# Altium footprint library self_pcblib v1.8.6.PcbLib: 164 footprints (part 5 of 11)
Each footprint in its own frame and in the unit in brackets; x right, y up, seen from the top. Pads: shape width x height; smd on the part's side, far side on the other; paste and mask are expansions set on the pad; w line width, h text height; cw(c..) or ccw(c..) is an arc to the next point about the centre after c.
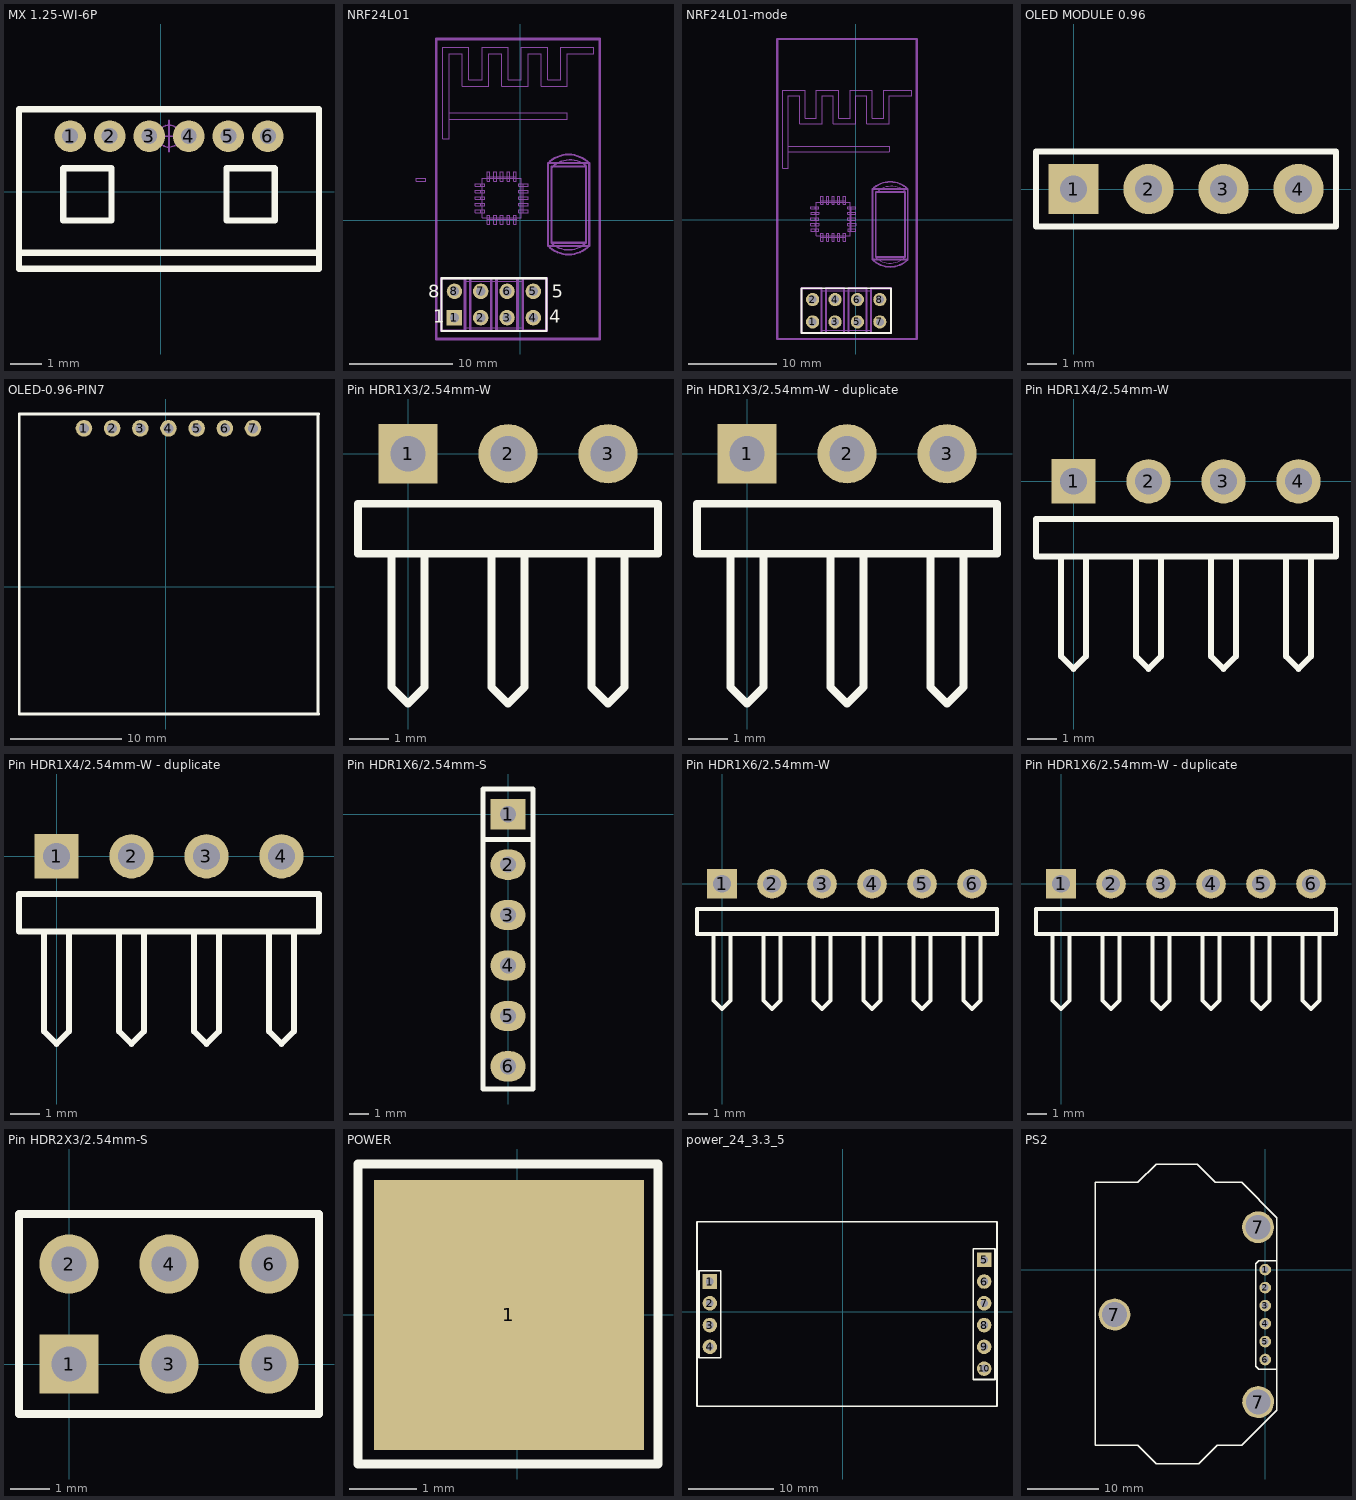
[diagram p4: the footprints below, top view; thin cyan lines are the x and y axes]

## MX 1.25-WI-6P [mm]
pads (6):
  round 1 hole 0.5: 1(-2.859,1.755) 2(-1.609,1.755) 3(-0.359,1.755) 4(0.891,1.755) 5(2.141,1.755) 6(3.391,1.755)
Top Overlay:
  lines w0.2: -4.473,-1.928 5.005,-1.928 ; -4.473,-2.436 -4.473,2.605 5.005,2.605 5.005,-2.436 -4.473,-2.436 ; -3.076,-0.912 -3.076,0.739 -1.552,0.739 -1.552,-0.912 -3.076,-0.912 ; 2.084,-0.912 2.084,0.739 3.608,0.739 3.608,-0.912 2.084,-0.912
Mechanical 15:
  circle w0.05: c0.266,1.755 r0.35
  lines w0.05: -0.234,1.755 0.766,1.755 ; 0.266,1.255 0.266,2.255
3D body "MOLEX1.25-WI-6P.STEP": height 3.35, standoff -2.1, extent -4.359,-2.295 4.891,2.605

## NRF24L01 [mm]
pads (8):
  rect 1.5x1.5 hole 0.9: 1(-6.35,-9.398)
  round 1.5 hole 0.9: 2(-3.81,-9.398) 3(-1.27,-9.398) 4(1.27,-9.398) 5(1.27,-6.858) 6(-1.27,-6.858) 7(-3.81,-6.858) 8(-6.35,-6.858)
Top Overlay:
  lines w0.2: -7.62,-10.668 2.54,-10.668 2.54,-5.588 -7.62,-5.588 -7.62,-10.668
  text "5" at 3.048,-7.493 h1.27
  text "1" at -8.382,-9.906 h1.27
  text "4" at 2.794,-9.906 h1.27
  text "8" at -8.89,-7.493 h1.27
Mechanical 1:
  drawing of 171 lines, arcs and shapes, not listed
3D body: height 2, standoff 0, extent 0.254,-10.668 2.54,-5.588
3D body: height 2, standoff 0, extent -0.254,-10.361 0.254,-5.861
3D body: height 2, standoff 0, extent -2.286,-10.668 -0.254,-5.588
3D body: height 2, standoff 0, extent -2.818,-10.361 -2.286,-5.861
3D body: height 2, standoff 0, extent -4.826,-10.668 -2.794,-5.588
3D body: height 2, standoff 0, extent -5.334,-10.361 -4.826,-5.861
3D body: height 2, standoff 0, extent -7.62,-10.668 -5.334,-5.588
3D body: height 3, standoff 2, extent -8.118,-11.461 7.682,17.539
3D body: height 4, standoff 0, extent 0.921,-7.208 1.619,-6.511
3D body: height 4, standoff 0, extent 0.921,-9.748 1.62,-9.051
3D body: height 4, standoff 0, extent -1.619,-7.208 -0.92,-6.511
3D body: height 4, standoff 0, extent -1.619,-9.748 -0.92,-9.051
3D body: height 4, standoff 0, extent -4.159,-7.208 -3.46,-6.511
3D body: height 4, standoff 0, extent -4.159,-9.748 -3.46,-9.051
3D body: height 4, standoff 0, extent -6.699,-7.208 -6,-6.511
3D body: height 4, standoff 0, extent -6.699,-9.748 -6,-9.051
3D body: height 4, standoff 0, extent -6.699,-9.748 -6.001,-9.051
3D body: height 4, standoff 0, extent -6.699,-7.208 -6.001,-6.511
3D body: height 4, standoff 0, extent -4.159,-7.208 -3.461,-6.511
3D body: height 4, standoff 0, extent -4.159,-9.748 -3.46,-9.051
3D body: height 4, standoff 0, extent -1.619,-9.748 -0.92,-9.051
3D body: height 4, standoff 0, extent -1.619,-7.208 -0.92,-6.511
3D body: height 4, standoff 0, extent 0.921,-7.208 1.62,-6.511
3D body: height 4, standoff 0, extent 0.921,-9.748 1.62,-9.051
3D body: height 3.5, standoff 3, extent 2.682,-2.461 6.682,5.539
3D body: height 3.5, standoff 3, extent 2.586,2.439 6.778,6.622
3D body: height 3.5, standoff 3, extent 2.586,-3.561 6.778,0.622
3D body: height 5, standoff 3, extent 2.983,2.598 6.416,6.024
3D body: height 5, standoff 3, extent 3.11,-2.736 6.543,0.69
3D body: height 5, standoff 3.5, extent 3.048,-2.159 6.35,5.207
3D body: height 3.5, standoff 3, extent -3.683,0.254 0.127,4.064
3D body: height 3.1, standoff 3, extent -4.318,3.302 -3.81,3.556
3D body: height 3.1, standoff 3, extent -4.318,2.667 -3.828,2.921
3D body: height 3.1, standoff 3, extent -4.313,2.032 -3.823,2.286
3D body: height 3.1, standoff 3, extent -4.318,1.397 -3.828,1.651
3D body: height 3.1, standoff 3, extent -4.318,0.762 -3.828,1.016
3D body: height 3.1, standoff 3, extent -3.175,-0.381 -2.908,0.099
3D body: height 3.1, standoff 3, extent -2.54,-0.381 -2.286,0.099
3D body: height 3.1, standoff 3, extent -1.905,-0.381 -1.651,0.099
3D body: height 3.1, standoff 3, extent -1.27,-0.381 -1.016,0.099
3D body: height 3.1, standoff 3, extent -0.635,-0.381 -0.381,0.099
3D body: height 3.1, standoff 3, extent 0.282,0.762 0.762,1.016
3D body: height 3.1, standoff 3, extent 0.282,1.397 0.762,1.651
3D body: height 3.1, standoff 3, extent 0.282,2.032 0.762,2.286
3D body: height 3.1, standoff 3, extent 0.282,2.667 0.762,2.921
3D body: height 3.1, standoff 3, extent 0.282,3.302 0.762,3.556
3D body: height 3.1, standoff 3, extent -0.648,4.219 -0.381,4.699
3D body: height 3.1, standoff 3, extent -1.27,4.229 -1.016,4.699
3D body: height 3.1, standoff 3, extent -1.905,4.219 -1.651,4.699
3D body: height 3.1, standoff 3, extent -2.54,4.229 -2.286,4.699
3D body: height 3.1, standoff 3, extent -3.175,4.229 -2.921,4.699
3D body: height 3.25, standoff 3, extent -0.127,3.302 0.282,3.556
3D body: height 3.25, standoff 3, extent -0.127,2.667 0.282,2.921
3D body: height 3.25, standoff 3, extent -0.127,2.032 0.282,2.286
3D body: height 3.25, standoff 3, extent -0.127,1.397 0.282,1.651
3D body: height 3.25, standoff 3, extent -0.127,0.762 0.282,1.016
3D body: height 3.25, standoff 3, extent -0.635,0.089 -0.381,0.508
3D body: height 3.25, standoff 3, extent -1.27,0.099 -1.016,0.508
3D body: height 3.25, standoff 3, extent -1.918,0.099 -1.651,0.508
3D body: height 3.25, standoff 3, extent -2.54,0.099 -2.286,0.508
3D body: height 3.25, standoff 3, extent -3.175,0.099 -2.921,0.508
3D body: height 3.25, standoff 3, extent -3.828,0.762 -3.429,1.016
3D body: height 3.25, standoff 3, extent -3.828,1.397 -3.429,1.651
3D body: height 3.25, standoff 3, extent -3.828,2.032 -3.429,2.286
3D body: height 3.25, standoff 3, extent -3.828,2.667 -3.429,2.921
3D body: height 3.25, standoff 3, extent -3.81,3.302 -3.429,3.556
3D body: height 3.25, standoff 3, extent -3.175,3.81 -2.921,4.229
3D body: height 3.25, standoff 3, extent -2.54,3.81 -2.286,4.219
3D body: height 3.25, standoff 3, extent -1.905,3.81 -1.651,4.219
3D body: height 3.25, standoff 3, extent -1.27,3.81 -1.016,4.219
3D body: height 3.25, standoff 3, extent -0.635,3.81 -0.381,4.219
3D body: height 3.01, standoff 3, extent -7.493,7.874 7.112,16.764
3D body: height 3.01, standoff 3, extent -6.858,9.779 4.572,10.414

## NRF24L01-mode [mm]
pads (8):
  round 1.5 hole 0.9: 1(-4.902,-11.582) 2(-4.902,-9.042) 3(-2.362,-11.582) 4(-2.362,-9.042) 5(0.178,-11.582) 6(0.178,-9.042) 7(2.718,-11.582) 8(2.718,-9.042)
Top Overlay:
  lines w0.2: -6.172,-12.852 3.988,-12.852 3.988,-7.772 -6.172,-7.772 -6.172,-12.852
Mechanical 1:
  drawing of 167 lines, arcs and shapes, not listed
3D body: height 2, standoff 0, extent 1.702,-12.852 3.988,-7.772
3D body: height 2, standoff 0, extent 1.194,-12.545 1.702,-8.045
3D body: height 2, standoff 0, extent -0.838,-12.852 1.194,-7.772
3D body: height 2, standoff 0, extent -1.37,-12.545 -0.838,-8.045
3D body: height 2, standoff 0, extent -3.378,-12.852 -1.346,-7.772
3D body: height 2, standoff 0, extent -3.886,-12.545 -3.378,-8.045
3D body: height 2, standoff 0, extent -6.172,-12.852 -3.886,-7.772
3D body: height 3, standoff 2, extent -8.905,-13.518 6.895,15.482
3D body: height 4, standoff 0, extent 2.369,-9.392 3.067,-8.695
3D body: height 4, standoff 0, extent 2.369,-11.933 3.067,-11.235
3D body: height 4, standoff 0, extent -0.171,-9.393 0.527,-8.695
3D body: height 4, standoff 0, extent -0.171,-11.933 0.527,-11.235
3D body: height 4, standoff 0, extent -2.711,-9.393 -2.013,-8.695
3D body: height 4, standoff 0, extent -2.711,-11.933 -2.013,-11.235
3D body: height 4, standoff 0, extent -5.251,-9.392 -4.553,-8.695
3D body: height 4, standoff 0, extent -5.251,-11.933 -4.553,-11.235
3D body: height 4, standoff 0, extent -5.251,-11.933 -4.553,-11.235
3D body: height 4, standoff 0, extent -5.251,-9.393 -4.553,-8.695
3D body: height 4, standoff 0, extent -2.711,-9.392 -2.013,-8.695
3D body: height 4, standoff 0, extent -2.711,-11.933 -2.013,-11.235
3D body: height 4, standoff 0, extent -0.171,-11.932 0.527,-11.235
3D body: height 4, standoff 0, extent -0.171,-9.392 0.527,-8.695
3D body: height 4, standoff 0, extent 2.369,-9.393 3.067,-8.695
3D body: height 4, standoff 0, extent 2.369,-11.933 3.067,-11.235
3D body: height 3.5, standoff 3, extent 1.895,-4.518 5.895,3.482
3D body: height 3.5, standoff 3, extent 1.799,0.381 5.991,4.565
3D body: height 3.5, standoff 3, extent 1.799,-5.619 5.991,-1.435
3D body: height 5, standoff 3, extent 2.195,0.54 5.628,3.967
3D body: height 5, standoff 3, extent 2.322,-4.793 5.755,-1.367
3D body: height 5, standoff 3.5, extent 2.261,-4.216 5.563,3.15
3D body: height 3.5, standoff 3, extent -4.47,-1.803 -0.66,2.007
3D body: height 3.1, standoff 3, extent -5.105,1.245 -4.597,1.499
3D body: height 3.1, standoff 3, extent -5.105,0.61 -4.615,0.864
3D body: height 3.1, standoff 3, extent -5.1,-0.025 -4.61,0.229
3D body: height 3.1, standoff 3, extent -5.105,-0.66 -4.615,-0.406
3D body: height 3.1, standoff 3, extent -5.105,-1.295 -4.615,-1.041
3D body: height 3.1, standoff 3, extent -3.962,-2.438 -3.695,-1.958
3D body: height 3.1, standoff 3, extent -3.327,-2.438 -3.073,-1.958
3D body: height 3.1, standoff 3, extent -2.692,-2.438 -2.438,-1.958
3D body: height 3.1, standoff 3, extent -2.057,-2.438 -1.803,-1.958
3D body: height 3.1, standoff 3, extent -1.422,-2.438 -1.168,-1.958
3D body: height 3.1, standoff 3, extent -0.505,-1.295 -0.025,-1.041
3D body: height 3.1, standoff 3, extent -0.505,-0.66 -0.025,-0.406
3D body: height 3.1, standoff 3, extent -0.505,-0.025 -0.025,0.229
3D body: height 3.1, standoff 3, extent -0.505,0.61 -0.025,0.864
3D body: height 3.1, standoff 3, extent -0.505,1.245 -0.025,1.499
3D body: height 3.1, standoff 3, extent -1.435,2.162 -1.168,2.642
3D body: height 3.1, standoff 3, extent -2.057,2.172 -1.803,2.642
3D body: height 3.1, standoff 3, extent -2.692,2.162 -2.438,2.642
3D body: height 3.1, standoff 3, extent -3.327,2.172 -3.073,2.642
3D body: height 3.1, standoff 3, extent -3.962,2.172 -3.708,2.642
3D body: height 3.25, standoff 3, extent -0.914,1.245 -0.505,1.499
3D body: height 3.25, standoff 3, extent -0.914,0.61 -0.505,0.864
3D body: height 3.25, standoff 3, extent -0.914,-0.025 -0.505,0.229
3D body: height 3.25, standoff 3, extent -0.914,-0.66 -0.505,-0.406
3D body: height 3.25, standoff 3, extent -0.914,-1.295 -0.505,-1.041
3D body: height 3.25, standoff 3, extent -1.422,-1.968 -1.168,-1.549
3D body: height 3.25, standoff 3, extent -2.057,-1.958 -1.803,-1.549
3D body: height 3.25, standoff 3, extent -2.705,-1.958 -2.438,-1.549
3D body: height 3.25, standoff 3, extent -3.327,-1.958 -3.073,-1.549
3D body: height 3.25, standoff 3, extent -3.962,-1.958 -3.708,-1.549
3D body: height 3.25, standoff 3, extent -4.615,-1.295 -4.216,-1.041
3D body: height 3.25, standoff 3, extent -4.615,-0.66 -4.216,-0.406
3D body: height 3.25, standoff 3, extent -4.615,-0.025 -4.216,0.229
3D body: height 3.25, standoff 3, extent -4.615,0.61 -4.216,0.864
3D body: height 3.25, standoff 3, extent -4.597,1.245 -4.216,1.499
3D body: height 3.25, standoff 3, extent -3.962,1.753 -3.708,2.172
3D body: height 3.25, standoff 3, extent -3.327,1.753 -3.073,2.162
3D body: height 3.25, standoff 3, extent -2.692,1.753 -2.438,2.162
3D body: height 3.25, standoff 3, extent -2.057,1.753 -1.803,2.162
3D body: height 3.25, standoff 3, extent -1.422,1.753 -1.168,2.162
3D body: height 3.01, standoff 3, extent -8.28,5.817 6.325,14.707
3D body: height 3.01, standoff 3, extent -7.645,7.722 3.785,8.357

## OLED MODULE 0.96 [mm] "0.96寸OLED显示屏"
pads (4):
  rect 1.7x1.7 hole 0.9: 1(0,0)
  round 1.7 hole 0.9: 2(2.54,0) 3(5.08,0) 4(7.62,0)
Top Overlay:
  lines w0.2: -1.27,-1.27 -1.27,1.27 8.89,1.27 8.89,-1.27 -1.27,-1.27
3D body "User Library-128x64I2COLEDDisplayAdafruit.STEP": height 13.47, standoff 2.63, extent -9.65,-25.46 17.05,2.4
3D body "HDR2.54-1P_M.STEP": height 8.5, standoff -3, extent 1.27,-1.27 3.81,1.27
3D body "HDR2.54-1P_M.STEP": height 8.5, standoff -3, extent -1.27,-1.27 1.27,1.27
3D body "HDR2.54-1P_M.STEP": height 8.5, standoff -3, extent 6.35,-1.27 8.89,1.27
3D body "HDR2.54-1P_M.STEP": height 8.5, standoff -3, extent 3.81,-1.27 6.35,1.27

## OLED-0.96-PIN7 [mm]
pads (7):
  round 1.5 hole 0.9: 1(-7.366,14.301) 2(-4.826,14.301) 3(-2.286,14.301) 4(0.254,14.301) 5(2.794,14.301) 6(5.334,14.301) 7(7.874,14.301)
Top Overlay:
  lines w0.254: -13.2,-11.456 13.8,-11.456 ; -13.2,-11.405 -13.2,15.595 13.8,15.595 ; 13.724,-11.456 13.724,15.595
3D body "OLED-0.96.step": height 3.22, standoff -0.62, extent -12.946,-9.932 13.754,12.272

## Pin HDR1X3/2.54mm-W [mm] "Connector; Header; 3 Position; Right Angle"
pads (3):
  rect 1.5x1.5 hole 0.9: 1(0,0)
  round 1.5 hole 0.9: 2(2.54,0) 3(5.08,0)
Top Overlay:
  lines w0.2: -0.423,-2.54 -0.423,-5.927 0,-6.35 0.423,-5.927 0.423,-2.54 ; 2.117,-2.54 2.117,-5.927 2.54,-6.35 2.963,-5.927 2.963,-2.54 ; 4.657,-2.54 4.657,-5.927 5.08,-6.35 5.503,-5.927 5.503,-2.54 ; -1.27,-2.54 -1.27,-1.27 6.35,-1.27 6.35,-2.54 -1.27,-2.54
3D body "hdr3.stp": height 2.54, standoff -1, extent -1.27,-9.969 6.35,0.381

## Pin HDR1X3/2.54mm-W - duplicate [mm] "Connector; Header; 3 Position; Right Angle"
pads (3):
  rect 1.5x1.5 hole 0.9: 1(0,0)
  round 1.5 hole 0.9: 2(2.54,0) 3(5.08,0)
Top Overlay:
  lines w0.2: -0.423,-2.54 -0.423,-5.927 0,-6.35 0.423,-5.927 0.423,-2.54 ; 2.117,-2.54 2.117,-5.927 2.54,-6.35 2.963,-5.927 2.963,-2.54 ; 4.657,-2.54 4.657,-5.927 5.08,-6.35 5.503,-5.927 5.503,-2.54 ; -1.27,-2.54 6.35,-2.54 6.35,-1.27 -1.27,-1.27 -1.27,-2.54
3D body "hdr3.stp": height 2.54, standoff -1, extent -1.27,-9.969 6.35,0.381

## Pin HDR1X4/2.54mm-W [mm] "Connector; Header; 4 Position; Right Angle"
pads (4):
  rect 1.5x1.5 hole 0.9: 1(0,0)
  round 1.5 hole 0.9: 2(2.54,0) 3(5.08,0) 4(7.62,0)
Top Overlay:
  lines w0.2: -0.423,-2.54 -0.423,-5.927 0,-6.35 0.423,-5.927 0.423,-2.54 ; 2.117,-2.54 2.117,-5.927 2.54,-6.35 2.963,-5.927 2.963,-2.54 ; 4.657,-2.54 4.657,-5.927 5.08,-6.35 5.503,-5.927 5.503,-2.54 ; 7.197,-2.54 7.197,-5.927 7.62,-6.35 8.043,-5.927 8.043,-2.54 ; -1.27,-2.54 -1.27,-1.27 8.89,-1.27 8.89,-2.54 -1.27,-2.54
3D body "hdr4.stp": height 2.54, standoff -1, extent -1.27,-10.001 8.89,0.349

## Pin HDR1X4/2.54mm-W - duplicate [mm] "Connector; Header; 4 Position; Right Angle"
pads (4):
  rect 1.5x1.5 hole 0.9: 1(0,0)
  round 1.5 hole 0.9: 2(2.54,0) 3(5.08,0) 4(7.62,0)
Top Overlay:
  lines w0.2: -0.423,-2.54 -0.423,-5.927 0,-6.35 0.423,-5.927 0.423,-2.54 ; 2.117,-2.54 2.117,-5.927 2.54,-6.35 2.963,-5.927 2.963,-2.54 ; 4.657,-2.54 4.657,-5.927 5.08,-6.35 5.503,-5.927 5.503,-2.54 ; 7.197,-2.54 7.197,-5.927 7.62,-6.35 8.043,-5.927 8.043,-2.54 ; -1.27,-2.54 -1.27,-1.27 8.89,-1.27 8.89,-2.54 -1.27,-2.54
3D body "hdr4.stp": height 2.54, standoff -1, extent -1.27,-10.001 8.89,0.349

## Pin HDR1X6/2.54mm-S [mil]
pads (6):
  rect 70x60 hole 32: 1(0,0)
  oval 70x60 hole 32: 2(0,-100) 3(0,-200) 4(0,-300) 5(0,-400) 6(0,-500)
Top Overlay:
  lines w10: -50,-50 50,-50 ; -50,-545 -50,50 50,50 50,-545 -50,-545
3D body "1001-6.STEP": height 336.22, standoff -118.11, extent -50,-545 50,55

## Pin HDR1X6/2.54mm-W [mm] "Connector; Header; 6 Position; Right Angle"
pads (6):
  rect 1.5x1.5 hole 0.9: 1(0,0)
  round 1.5 hole 0.9: 2(2.54,0) 3(5.08,0) 4(7.62,0) 5(10.16,0) 6(12.7,0)
Top Overlay:
  lines w0.2: -0.423,-2.54 -0.423,-5.927 0,-6.35 0.423,-5.927 0.423,-2.54 ; 2.117,-2.54 2.117,-5.927 2.54,-6.35 2.963,-5.927 2.963,-2.54 ; 4.657,-2.54 4.657,-5.927 5.08,-6.35 5.503,-5.927 5.503,-2.54 ; 7.197,-2.54 7.197,-5.927 7.62,-6.35 8.043,-5.927 8.043,-2.54 ; 9.737,-2.54 9.737,-5.927 10.16,-6.35 10.583,-5.927 10.583,-2.54 ; 12.277,-2.54 12.277,-5.927 12.7,-6.35 13.123,-5.927 13.123,-2.54 ; -1.27,-2.54 13.97,-2.54 13.97,-1.27 -1.27,-1.27 -1.27,-2.54
3D body "hdr6.stp": height 2.54, standoff -1, extent -1.27,-9.969 13.97,0.381

## Pin HDR1X6/2.54mm-W - duplicate [mm] "Connector; Header; 6 Position; Right Angle"
pads (6):
  rect 1.5x1.5 hole 0.9: 1(0,0)
  round 1.5 hole 0.9: 2(2.54,0) 3(5.08,0) 4(7.62,0) 5(10.16,0) 6(12.7,0)
Top Overlay:
  lines w0.2: -0.423,-2.54 -0.423,-5.927 0,-6.35 0.423,-5.927 0.423,-2.54 ; 2.117,-2.54 2.117,-5.927 2.54,-6.35 2.963,-5.927 2.963,-2.54 ; 4.657,-2.54 4.657,-5.927 5.08,-6.35 5.503,-5.927 5.503,-2.54 ; 7.197,-2.54 7.197,-5.927 7.62,-6.35 8.043,-5.927 8.043,-2.54 ; 9.737,-2.54 9.737,-5.927 10.16,-6.35 10.583,-5.927 10.583,-2.54 ; 12.277,-2.54 12.277,-5.927 12.7,-6.35 13.123,-5.927 13.123,-2.54 ; -1.27,-2.54 13.97,-2.54 13.97,-1.27 -1.27,-1.27 -1.27,-2.54
3D body "hdr6.stp": height 2.54, standoff -1, extent -1.27,-9.969 13.97,0.381

## Pin HDR2X3/2.54mm-S [mm] "Connector; Header; 3x2 Position"
pads (6):
  rect 1.5x1.5 hole 0.9: 1(0,0)
  round 1.5 hole 0.9: 2(0,2.54) 3(2.54,0) 4(2.54,2.54) 5(5.08,0) 6(5.08,2.54)
Top Overlay:
  lines w0.2: 1.482,-1.27 6.35,-1.27 ; 6.35,-1.27 -1.27,-1.27 -1.27,3.81 6.35,3.81 6.35,-1.27
3D body "HEADER.STEP": height 7.58, standoff -2.94, extent 3.81,1.27 6.35,3.81
3D body "HEADER.STEP": height 7.58, standoff -2.94, extent 3.81,-1.27 6.35,1.27
3D body "HEADER.STEP": height 7.58, standoff -2.94, extent -1.27,-1.27 1.27,1.27
3D body "HEADER.STEP": height 7.58, standoff -2.94, extent 1.27,-1.27 3.81,1.27
3D body "HEADER.STEP": height 7.58, standoff -2.94, extent -1.27,1.27 1.27,3.81
3D body "HEADER.STEP": height 7.58, standoff -2.94, extent 1.27,1.27 3.81,3.81

## POWER [mm]
pads (1):
  rect 4x4 smd: 1(-0.127,0)
Top Overlay:
  lines w0.127: -2.362,-2.21 2.083,-2.21 2.083,2.235 -2.362,2.235 -2.362,-2.21
3D body "link_p.stp": height 0.1, standoff 0, extent -2.127,-2 1.873,2

## power_24_3.3_5 [mm]
pads (10):
  rect 1.7x1.7 hole 0.9: 1(-15.5,3.54) 5(16.5,6.08)
  round 1.7 hole 0.9: 2(-15.5,1) 3(-15.5,-1.54) 4(-15.5,-4.08) 6(16.5,3.54) 7(16.5,1) 8(16.5,-1.54) 9(16.5,-4.08) 10(16.5,-6.62)
Top Overlay:
  lines w0.2: -16.77,-5.35 -16.77,4.81 -14.23,4.81 -14.23,-5.35 -16.77,-5.35 ; 15.23,-7.89 17.77,-7.89 17.77,7.35 15.23,7.35 15.23,-7.89
  lines w0.203: -17,-11 -17,10.5 18,10.5 18,-11 -17,-11
3D body "HDR2.54-1P_M.STEP": height 8.5, standoff -3, extent -16.77,-0.27 -14.23,2.27
3D body "HDR2.54-1P_M.STEP": height 8.5, standoff -3, extent -16.77,2.27 -14.23,4.81
3D body "HDR2.54-1P_M.STEP": height 8.5, standoff -3, extent -16.77,-5.35 -14.23,-2.81
3D body "HDR2.54-1P_M.STEP": height 8.5, standoff -3, extent -16.77,-2.81 -14.23,-0.27
3D body "HDR2.54-1P_M.STEP": height 8.5, standoff -3, extent 15.23,-0.27 17.77,2.27
3D body "HDR2.54-1P_M.STEP": height 8.5, standoff -3, extent 15.23,4.81 17.77,7.35
3D body "HDR2.54-1P_M.STEP": height 8.5, standoff -3, extent 15.23,2.27 17.77,4.81
3D body "HDR2.54-1P_M.STEP": height 8.5, standoff -3, extent 15.23,-7.89 17.77,-5.35
3D body "HDR2.54-1P_M.STEP": height 8.5, standoff -3, extent 15.23,-2.81 17.77,-0.27
3D body "HDR2.54-1P_M.STEP": height 8.5, standoff -3, extent 15.23,-5.35 17.77,-2.81

## PS2 [mil]
pads (9):
  round 65 hole 39: 1(0,0) 2(0,-100) 3(0,-200) 4(0,-300) 5(0,-400) 6(0,-500)
  round 177.17 hole 137.8: 7(-838.58,-250) 7(-40,236.22) 7(-39.37,-736.63)
Top Overlay:
  lines w8: 63.98,-555.12 -35.43,-555.12 -54.13,-536.42 -54.13,32.48 -37.4,49.21 63.98,49.21 ; -946.25,-977 -946.25,486 -708.88,486 -607.28,587.6 -378.94,587.6 -277.34,486 -131.67,486 65,289.33 65,-781.46 -130.54,-977 -266.37,-977 -370.08,-1080.71 -605.31,-1080.71 -709.02,-977 -946.25,-977